# Altium footprint library xhayqua.PcbLib: 185 footprints (part 12 of 12)
Each footprint in its own frame and in the unit in brackets; x right, y up, seen from the top. Pads: shape width x height; smd on the part's side, far side on the other; paste and mask are expansions set on the pad; w line width, h text height; cw(c..) or ccw(c..) is an arc to the next point about the centre after c.
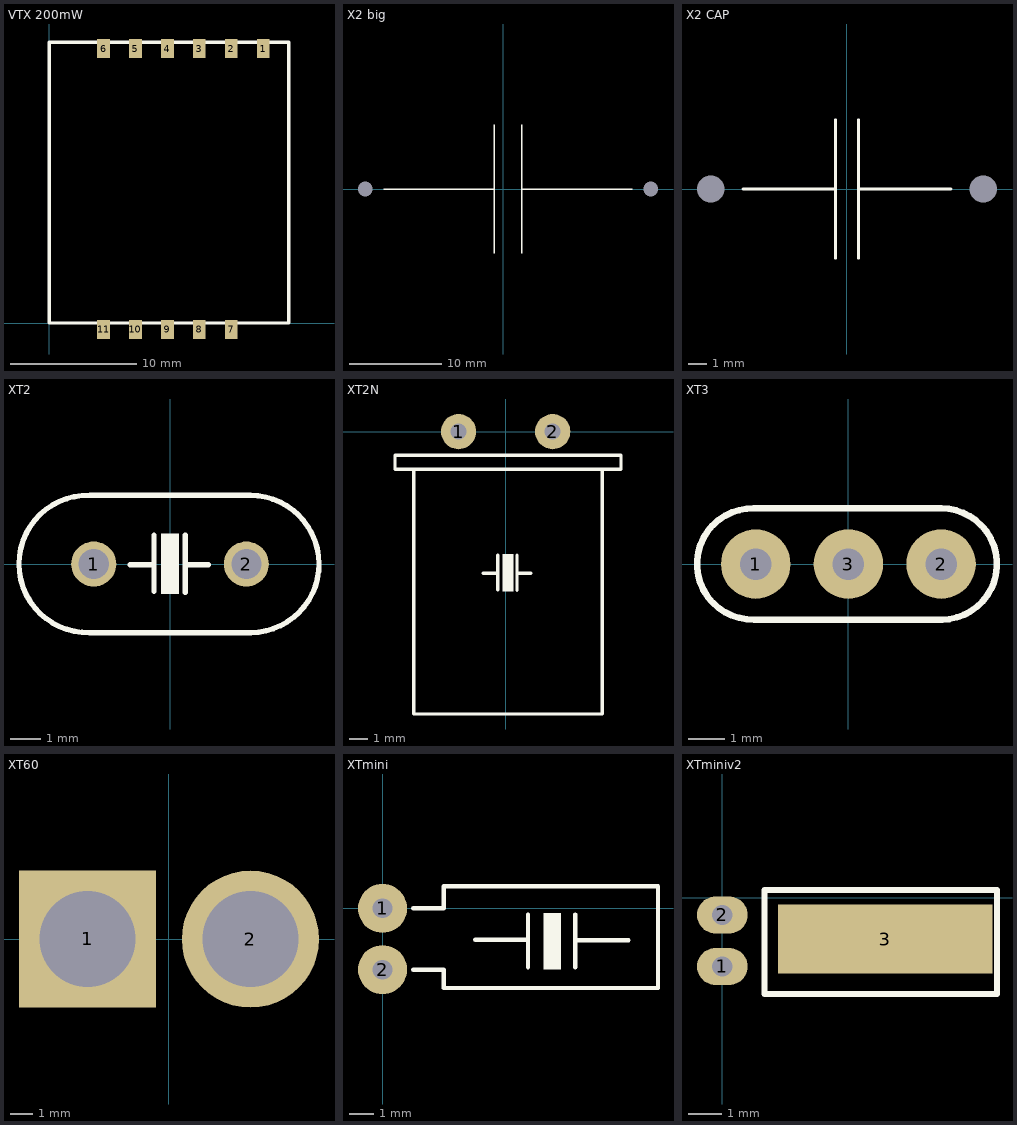
[diagram p11: the footprints below, top view; thin cyan lines are the x and y axes]

## VTX 200mW [mil] "Video transmiter 5.8GHz 200mW"
pads (11):
  rect 40x60 smd: 1(670,860) 2(570,860) 3(470,860) 4(370,860) 5(270,860) 6(170,860) 7(570,-20) 8(470,-20) 9(370,-20) 10(270,-20) 11(170,-20)
Top Overlay:
  lines w10: 0,0 750,0 750,880 0,880 0,0

## X2 big [mm] "4uF X2 SAFESTY RATED CAP 275 VAC, WHT 37mmX25mmX14mm 31mm LEAD SPACING"
pads (2):
  round 0 / inner round 0 / far side round 3 hole 1.6: 1(-15,0) 2(16,0)
Top Overlay:
  lines w0.15: -13,0 -1,0 ; -1,-7 -1,7 ; 2,-7 2,7 ; 2,0 3,0 14,0
3D body "User Library-Hua Jung MKP-185K0305AB1221-P.step": height 24.01, standoff -2.8, extent -12.5,-6 13.5,6.501

## X2 CAP [mm] "0.47uF X2 RATED SAFETY CAP 310 VAC WHT 18mmX14mmX8mm LEAD SPACING 15mm"
pads (2):
  round 0 / inner round 0 / far side round 2.5 hole 1.5: 1(-7.5,0) 2(7.5,0)
Top Overlay:
  lines w0.15: -5.715,0 -0.635,0 ; -0.635,-3.81 -0.635,3.81 ; 0.635,-3.81 0.635,3.81 ; 0.635,0 5.715,0
3D body "User Library-Hua Jung MKP-474K0305AB1151-P.step": height 15.01, standoff -2.8, extent -8.975,-4.016 9.025,3.985

## XT2 [mm]
pads (2):
  round 1.5 hole 1: 1(-2.54,0) 2(2.54,0)
Top Overlay:
  region: 0.292,1.016 0.292,-0.991 -0.292,-0.991 -0.292,1.016
  lines w0.178: -2.668,-2.286 2.69,-2.286 ccw(c2.675,0) 2.668,2.286 -2.666,2.286 ccw(c-2.743,0.001) -2.668,-2.283 ; -1.321,-0.025 -0.533,-0.025 ; -0.533,-0.914 -0.533,0.965 ; 0.508,-0.94 0.508,0.965 ; 0.508,-0.025 1.27,-0.025
3D body "SW3dPS-HP49US.STEP": height 3.5, standoff -4, extent -5.929,-2.364 5.421,2.286

## XT2N [mil]
pads (2):
  round 75 hole 34: 1(-100,0) 2(100,0)
Top Overlay:
  region: 16.5,-260 16.5,-339 -6.5,-339 -6.5,-260
  lines w7: -48,-301 -17,-301 ; -17,-336 -17,-262 ; 24,-337 24,-262 ; 24,-301 54,-301 ; -235,-80 -195,-80 ; -235,-80 -235,-50 ; -235,-80 -195,-80 ; -235,-80 -235,-50 ; -235,-50 245,-50 ; -235,-50 245,-50 ; -195,-600 -195,-80 ; -195,-600 205,-600 ; -195,-600 -195,-80 ; -195,-600 205,-600 ; -195,-80 205,-80 ; -195,-80 205,-80 ; 205,-600 205,-80 ; 205,-600 205,-80 ; 205,-80 245,-80 ; 205,-80 245,-80 ; 245,-80 245,-50 ; 245,-80 245,-50
3D body "SW3dPS-HC49U.STEP": height 91.44, standoff -92.52, extent -209.86,-594.33 230,14.33

## XT3 [mil]
pads (3):
  round 75 hole 34: 1(-100,0) 2(100,0) 3(0,0)
Top Overlay:
  lines w7: -102,60 98,60 ; -101.38,-59.91 cw(c-103.36,0.06) -101.35,60.02 ; -99,-60 101,-60 ; 100.13,60 cw(c100.31,0) 100.71,-60

## XT60 [mm]
pads (2):
  rect 6x6 hole 4.2: 1(-3.564,0.008)
  round 6 hole 4.2: 2(3.564,-0.008)
3D body "User Library-XT60 male.step": height 16.21, standoff -4.99, extent -7.688,-4.072 8.212,4.078

## XTmini [mil]
pads (2):
  round 80 hole 32: 1(0,0) 2(0,-100)
Top Overlay:
  rectangle: 262,-100 291,-8
  lines w7: 50,-100 100,-100 100,-130 449,-130 449,36 100,36 100,0 50,0 ; 151,-51 237,-51 ; 237,-96 237,-10 ; 314,-96 314,-10 ; 315,-52 401,-52

## XTminiv2 [mm]
pads (3):
  oval 1.5x1.1 hole 0.6 unplated: 1(0,-2.032) 2(0,-0.508)
  rect 6.35x2.032 smd: 3(4.826,-1.219)
Top Overlay:
  lines w0.178: 1.245,-0.762 1.245,0.229 8.128,0.229 8.128,-2.845 1.245,-2.845 1.245,0.025
3D body "User Library-DT-26-1.step": height 2, standoff -2, extent 0.562,-2.219 7.702,-0.219